# Altium footprint library kalios.PcbLib: 404 footprints (part 10 of 26)
Each footprint in its own frame and in the unit in brackets; x right, y up, seen from the top. Pads: shape width x height; smd on the part's side, far side on the other; paste and mask are expansions set on the pad; w line width, h text height; cw(c..) or ccw(c..) is an arc to the next point about the centre after c.
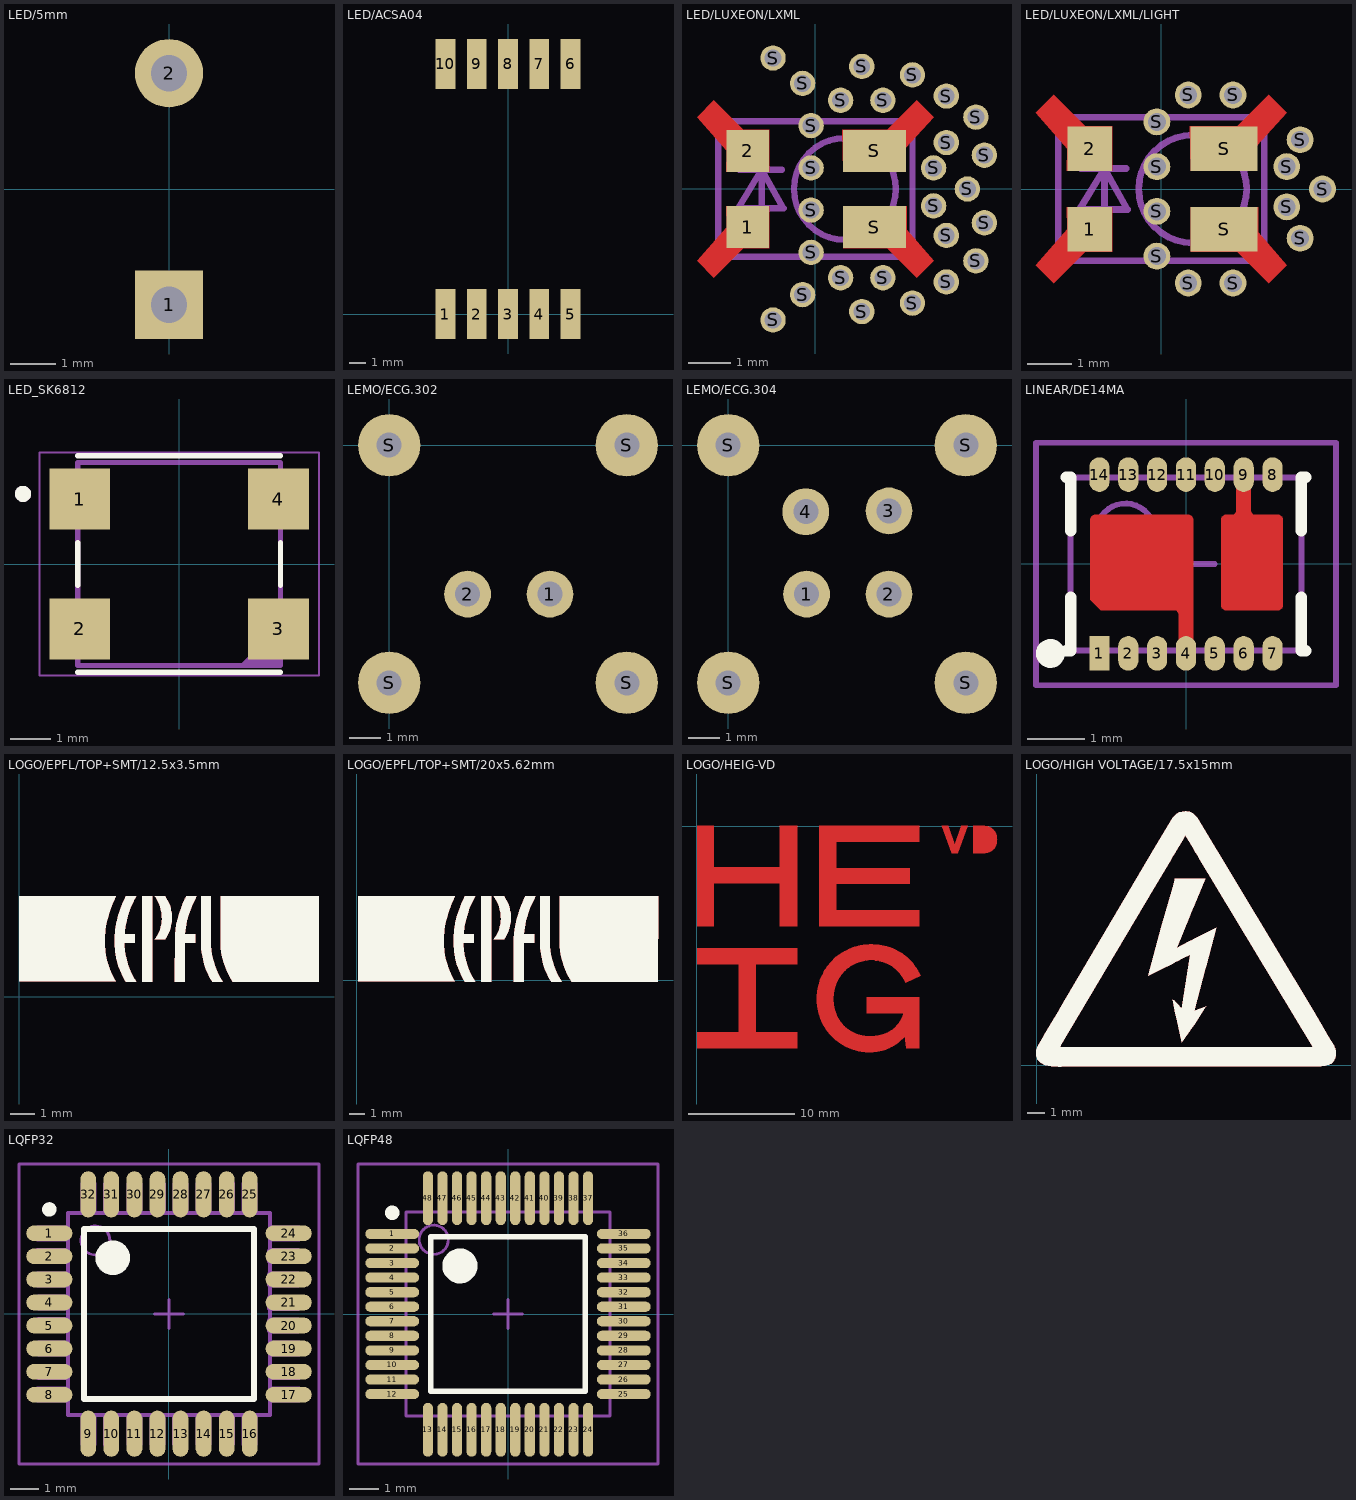
[diagram p9: the footprints below, top view; thin cyan lines are the x and y axes]

## LED/5mm [mm]
pads (2):
  rect 1.5x1.5 hole 0.8: 1(0,-2.54)
  round 1.5 hole 0.8: 2(0,2.54)
Top Designator:
  text ".Designator" at -7.618,-0.508 h1.52
3D body "led.STEP": height 13.86, standoff -1.97, extent -2.999,-2.7 2.999,3

## LED/ACSA04 [mm]
pads (10):
  rect 1.2x3 smd: 1(-3.76,0) 2(-1.88,0) 3(0,0) 4(1.88,0) 5(3.76,0) 6(3.76,15.04) 7(1.88,15.04) 8(0,15.04) 9(-1.88,15.04) 10(-3.76,15.04)
Top Designator:
  text ".Designator" at -7.617,7.012 h1.52
3D body "User Library-ACSA04_Blue.STEP": height 3.75, standoff -0.01, extent -4.56,0.01 4.56,15.03

## LED/LUXEON/LXML [mm]
pads (31):
  rect 1x1 smd: 1(-1.6,-0.9) 2(-1.6,0.9)
  round 0.6 hole 0.4: S(-1,-3.1) S(-1,3.1) S(-0.3,-2.5) S(-0.3,2.5) S(-0.1,-1.5) S(-0.1,-0.5) S(-0.1,0.5) S(-0.1,1.5) S(0.6,-2.1) S(0.6,2.1) S(1.1,-2.9) S(1.1,2.9) S(1.6,-2.1) S(1.6,2.1) S(2.3,-2.7) S(2.3,2.7) S(2.8,-0.4) S(2.8,0.5) S(3.1,-2.2) S(3.1,-1.1) S(3.1,1.1) S(3.1,2.2) S(3.6,0) S(3.8,-1.7) S(3.8,1.7) S(4,-0.8) S(4,0.8)
  rect 1.5x1 smd: S(1.4,-0.9) S(1.4,0.9)
Top Layer:
  region: 1.7,1.4 2.4,2.1 2.8,1.7 2.134,0.965 2.134,0.406 0.66,0.406 0.635,1.397
  region: 1.7,-1.4 2.4,-2.1 2.8,-1.7 2.159,-0.965 2.159,-0.406 0.66,-0.406 0.66,-1.397
  region: -1.7,-1.4 -2.4,-2.1 -2.8,-1.7 -2.1,-0.9 -2.108,-0.406 -1.092,-0.406 -1.092,-1.397
  region: -1.7,1.4 -2.4,2.1 -2.8,1.7 -2.1,0.9 -2.108,0.406 -1.092,0.406 -1.092,1.397
Top Courtyard:
  circle w0.15: c0.7,0 r1.204
  lines w0.15: -1.803,0.457 -0.787,0.457 ; -1.27,-0.889 -1.27,0.965 ; -1.27,0.457 -0.762,-0.457 ; -1.243,0.502 -1.829,-0.457 -0.749,-0.457 ; -2.3,-1.6 -2.3,1.6 2.3,1.6 2.3,-1.6 -2.3,-1.6
Top Designator:
  text ".Designator" at -6.817,-0.508 h1.52
3D body "LUXEON Rebel.STEP": height 1.98, standoff -0.01, extent -2.305,-1.585 2.305,1.585

## LED/LUXEON/LXML/LIGHT [mm]
pads (17):
  rect 1x1 smd: 1(-1.6,-0.9) 2(-1.6,0.9)
  round 0.6 hole 0.4: S(-0.1,-1.5) S(-0.1,-0.5) S(-0.1,0.5) S(-0.1,1.5) S(0.6,-2.1) S(0.6,2.1) S(1.6,-2.1) S(1.6,2.1) S(2.8,-0.4) S(2.8,0.5) S(3.1,-1.1) S(3.1,1.1) S(3.6,0)
  rect 1.5x1 smd: S(1.4,-0.9) S(1.4,0.9)
Top Layer:
  region: -1.7,1.4 -2.4,2.1 -2.8,1.7 -2.1,0.9 -2.108,0.406 -1.092,0.406 -1.092,1.397
  region: -1.7,-1.4 -2.4,-2.1 -2.8,-1.7 -2.1,-0.9 -2.108,-0.406 -1.092,-0.406 -1.092,-1.397
  region: 1.7,-1.4 2.4,-2.1 2.8,-1.7 2.159,-0.965 2.159,-0.406 0.66,-0.406 0.66,-1.397
  region: 1.7,1.4 2.4,2.1 2.8,1.7 2.134,0.965 2.134,0.406 0.66,0.406 0.635,1.397
Top Courtyard:
  circle w0.15: c0.7,0 r1.204
  lines w0.15: -1.803,0.457 -0.787,0.457 ; -1.27,-0.889 -1.27,0.965 ; -1.27,0.457 -0.762,-0.457 ; -1.243,0.502 -1.829,-0.457 -0.749,-0.457 ; -2.3,-1.6 2.3,-1.6 2.3,1.6 -2.3,1.6 -2.3,-1.6
Top Designator:
  text ".Designator" at -7.017,-0.508 h1.52
3D body "LUXEON Rebel.STEP": height 1.98, standoff -0.01, extent -2.305,-1.585 2.305,1.585

## LED_SK6812 [mm]
pads (4):
  rect 1.5x1.5 smd: 1(-2.45,1.6) 2(-2.45,-1.6) 3(2.45,-1.6) 4(2.45,1.6)
Top Overlay:
  circle w0.2: c-3.85,1.73 r0.1
  lines w0.127: -2.5,-2.67 2.5,-2.67 ; -2.5,-0.53 -2.5,0.53 ; -2.5,2.67 2.5,2.67 ; 2.5,-0.53 2.5,0.53
Top 3D Body:
  circle w0.2: c-3.85,1.73 r0.1
  region: 2.5,-2.5 1.5,-2.5 2.5,-1.5
  lines w0.127: -2.5,-2.5 2.5,-2.5 2.5,2.5 -2.5,2.5 -2.5,-2.5
Top Courtyard:
  lines w0.05: -3.45,-2.75 3.45,-2.75 3.45,2.75 -3.45,2.75 -3.45,-2.75
3D body "step_temp.STEP": height 1.6, standoff 0, extent -2.7,-2.5 2.7,2.5

## LEMO/ECG.302 [mm]
pads (6):
  round 1.5 hole 0.8 unplated: 1(5.156,-4.775) 2(2.515,-4.775)
  round 2 hole 0.8 unplated: S(0,-7.62) S(0,0) S(7.62,-7.62) S(7.62,0)
Top Designator:
  text ".Designator" at -3.79,1.681 h1.52
3D body "lemo2.STEP": height 12.69, standoff -3, extent -2.023,-10.211 9.677,14.589

## LEMO/ECG.304 [mm]
pads (8):
  round 1.5 hole 0.8 unplated: 1(2.515,-4.775) 2(5.156,-4.775) 3(5.156,-2.108) 4(2.489,-2.134)
  round 2 hole 0.8 unplated: S(0,-7.62) S(0,0) S(7.62,-7.62) S(7.62,0)
Top Designator:
  text ".Designator" at -3.79,1.681 h1.52
3D body "lemo4.STEP": height 12.69, standoff -3, extent -2.023,-10.211 9.677,14.589

## LINEAR/DE14MA [mm] "QFN, 14-Leads, Body 3.0x4.0mm (max), Pitch 0.50mm, IPC Medium Density"
height 0.75
pads (14):
  rect 0.35x0.6 smd: 1(-1.5,-1.55)
  oval 0.35x0.6 smd: 2(-1,-1.55) 3(-0.5,-1.55) 4(0,-1.55) 5(0.5,-1.55) 6(1,-1.55) 7(1.5,-1.55) 8(1.5,1.55) 9(1,1.55) 10(0.5,1.55) 11(0,1.55) 12(-0.5,1.55) 13(-1,1.55) 14(-1.5,1.55)
Top Layer:
  region: -1.656,-0.623 -1.479,-0.8 -0.206,-0.8 -0.19,-0.801 -0.161,-0.813 -0.139,-0.835 -0.127,-0.864 -0.126,-0.88 -0.126,-1.337 0.124,-1.337 0.124,0.77 0.124,0.786 0.112,0.816 0.09,0.838 0.06,0.85 0.044,0.85 -1.576,0.85 -1.591,0.85 -1.621,0.838 -1.643,0.816 -1.656,0.786 -1.656,0.77
  region: 0.61,-0.72 0.61,0.77 0.61,0.786 0.623,0.816 0.645,0.838 0.674,0.85 0.69,0.85 0.794,0.85 0.81,0.852 0.839,0.864 0.861,0.886 0.873,0.915 0.874,0.93 0.874,1.288 0.889,1.473 1.118,1.473 1.124,1.288 1.124,0.93 1.126,0.915 1.138,0.886 1.16,0.864 1.189,0.852 1.204,0.85 1.6,0.85 1.616,0.85 1.646,0.838 1.668,0.816 1.68,0.786 1.68,0.77 1.68,-0.72 1.68,-0.736 1.668,-0.765 1.646,-0.787 1.616,-0.8 1.6,-0.8 0.69,-0.8 0.674,-0.8 0.645,-0.787 0.623,-0.765 0.61,-0.736
Top Overlay:
  circle w0.25: c-2.35,-1.55 r0.125
  lines w0.2: -2.075,-1.5 -2,-1.5 -2,-0.575 ; -2.075,1.5 -2,1.5 -2,0.575 ; 2,-0.575 2,-1.5 2.075,-1.5 ; 2,0.575 2,1.5 2.075,1.5
Top 3D Body:
  circle w0.1: c-1.05,0.55 r0.5
  lines w0.1: -2,-1.5 2,-1.5 2,1.5 -2,1.5 -2,-1.5
Top Courtyard:
  lines w0.1: -0.5,0 0.5,0 ; 0,-0.5 0,0.5 ; -2.6,-2.1 2.6,-2.1 2.6,2.1 -2.6,2.1 -2.6,-2.1
Top Designator:
  text ".Designator" at -7.618,-0.508 h1.52
3D body "DE14MA.STEP": height 0.75, standoff -0.05, extent -2.007,-1.485 1.993,1.535

## LOGO/EPFL/TOP+SMT/12.5x3.5mm [mm]
Top Layer:
  region: 6.287,3.174 6.287,3.345 6.29,3.319
  region: 6.287,3.174 6.276,3.471 6.287,3.345
  region: 6.276,3.076 6.276,3.471 6.287,3.174
  region: 6.276,3.076 6.272,3.492 6.276,3.471
  region: 6.272,3.038 6.272,3.492 6.276,3.076
  region: 6.272,3.038 6.247,3.619 6.272,3.492
  region: 6.247,2.912 6.247,3.619 6.272,3.038
  region: 6.247,2.912 6.245,3.63 6.247,3.619
  region: 6.245,2.904 6.245,3.63 6.247,2.912
  region: 6.245,2.904 6.215,3.724 6.245,3.63
  region: 6.215,2.797 6.215,3.724 6.245,2.904
  region: 6.215,2.797 6.192,3.794 6.215,3.724
  region: 6.192,2.734 6.192,3.794 6.215,2.797
  region: 6.192,2.734 6.177,3.826 6.192,3.794
  region: 6.177,2.694 6.177,3.826 6.192,2.734
  region: 6.177,2.694 6.138,3.912 6.177,3.826
  region: 6.138,2.603 6.138,3.912 6.177,2.694
  region: 6.138,2.603 6.116,3.963 6.138,3.912
  region: 6.116,2.557 6.116,3.963 6.138,2.603
  region: 6.116,2.557 6.1,3.988 6.116,3.963
  region: 6.1,2.527 6.1,3.988 6.116,2.557
  region: 6.1,2.527 6.038,4.092 6.1,3.988
  region: 6.038,2.42 6.038,4.092 6.1,2.527
  region: 6.038,2.42 6.012,4.135 6.038,4.092
  region: 6.012,2.383 6.012,4.135 6.038,2.42
  region: 6.012,2.383 5.884,4.135 6.012,4.135
  region: 5.884,2.383 5.884,4.135 6.012,2.383
  region: 5.884,3.18 5.882,4.135 5.884,4.135
  region: 5.882,3.324 5.882,4.135 5.884,3.18
  region: 5.884,2.383 5.882,3.154 5.884,3.18
  region: 5.882,2.383 5.882,3.154 5.884,2.383
  region: 5.882,3.324 5.87,4.135 5.882,4.135
  region: 5.87,3.423 5.87,4.135 5.882,3.324
  region: 5.882,2.383 5.87,3.028 5.882,3.154
  region: 5.87,2.383 5.87,3.028 5.882,2.383
  region: 5.87,3.423 5.865,4.135 5.87,4.135
  region: 5.865,3.461 5.865,4.135 5.87,3.423
  region: 5.87,2.383 5.865,3.007 5.87,3.028
  region: 5.865,2.383 5.865,3.007 5.87,2.383
  region: 5.865,3.461 5.839,4.135 5.865,4.135
  region: 5.839,3.589 5.839,4.135 5.865,3.461
  region: 5.865,2.383 5.839,2.883 5.865,3.007
  region: 5.839,2.383 5.839,2.883 5.865,2.383
  region: 5.839,3.589 5.836,4.135 5.839,4.135
  region: 5.836,3.597 5.836,4.135 5.839,3.589
  region: 5.839,2.383 5.836,2.872 5.839,2.883
  region: 5.836,2.383 5.836,2.872 5.839,2.383
  region: 5.836,3.597 5.804,4.135 5.836,4.135
  region: 5.804,3.707 5.804,4.135 5.836,3.597
  region: 5.836,2.383 5.804,2.78 5.836,2.872
  region: 5.804,2.383 5.804,2.78 5.836,2.383
  region: 5.804,3.707 5.78,4.135 5.804,4.135
  region: 5.78,3.771 5.78,4.135 5.804,3.707
  region: 5.804,2.383 5.78,2.711 5.804,2.78
  region: 5.78,2.383 5.78,2.711 5.804,2.383
  region: 5.78,3.771 5.765,4.135 5.78,4.135
  region: 5.765,3.813 5.765,4.135 5.78,3.771
  region: 5.78,2.383 5.765,2.68 5.78,2.711
  region: 5.765,2.383 5.765,2.68 5.78,2.383
  region: 5.765,3.813 5.724,4.135 5.765,4.135
  region: 5.724,3.906 5.724,4.135 5.765,3.813
  region: 5.765,2.383 5.724,2.597 5.765,2.68
  region: 5.724,2.383 5.724,2.597 5.765,2.383
  region: 5.724,3.906 5.699,4.135 5.724,4.135
  region: 5.699,3.953 5.699,4.135 5.724,3.906
  region: 5.724,2.383 5.699,2.548 5.724,2.597
  region: 5.699,2.383 5.699,2.548 5.724,2.383
  region: 5.699,3.953 5.683,4.135 5.699,4.135
  region: 5.683,3.985 5.683,4.135 5.699,3.953
  region: 5.699,2.383 5.683,2.523 5.699,2.548
  region: 5.683,2.383 5.683,2.523 5.699,2.383
  region: 5.683,3.985 5.617,4.135 5.683,4.135
  region: 5.617,4.096 5.617,4.135 5.683,3.985
  region: 5.683,2.383 5.617,2.424 5.683,2.523
  region: 5.617,2.383 5.617,2.424 5.683,2.383
  region: 5.617,4.096 5.59,4.135 5.617,4.135
  region: 5.617,2.383 5.59,2.383 5.617,2.424
  region: 5.477,0.635 5.08,4.135 5.477,4.135
  region: 5.08,0.635 5.08,4.135 5.477,0.635
  region: 12.339,0.635 12.339,4.135 12.342,4.135
  region: 12.339,0.635 8.789,4.135 12.339,4.135
  region: 8.789,0.635 8.789,4.135 12.339,0.635
  region: 8.789,0.635 8.696,4.135 8.789,4.135
  region: 8.696,0.791 8.696,4.135 8.789,0.635
  region: 8.696,0.791 8.548,4.135 8.696,4.135
  region: 8.548,1.092 8.548,4.135 8.696,0.791
  region: 8.548,1.092 8.442,4.135 8.548,4.135
  region: 8.442,1.374 8.442,4.135 8.548,1.092
  region: 8.442,1.374 8.37,4.135 8.442,4.135
  region: 8.37,1.629 8.37,4.135 8.442,1.374
  region: 8.37,1.629 8.327,4.135 8.37,4.135
  region: 8.327,1.848 8.327,4.135 8.37,1.629
  region: 8.327,1.848 8.305,4.135 8.327,4.135
  region: 8.305,2.023 8.305,4.135 8.327,1.848
  region: 8.305,2.023 8.297,4.135 8.305,4.135
  region: 8.297,2.148 8.297,4.135 8.305,2.023
  region: 8.297,2.148 8.295,4.135 8.297,4.135
  region: 8.286,0.635 8.286,0.791 8.378,0.635
  region: 8.286,0.635 8.206,0.944 8.286,0.791
  region: 8.206,0.635 8.206,0.944 8.286,0.635
  region: 8.206,0.635 8.079,1.236 8.206,0.944
  region: 8.079,0.635 8.079,1.236 8.206,0.635
  region: 8.079,0.635 7.991,1.505 8.079,1.236
  region: 7.991,0.635 7.991,1.505 8.079,0.635
  region: 7.991,0.635 7.951,1.675 7.991,1.505
  region: 7.951,0.635 7.951,1.675 7.991,0.635
  region: 7.951,0.635 7.935,1.743 7.951,1.675
  region: 7.935,0.661 7.935,1.743 7.951,0.635
  region: 7.935,0.661 7.903,1.941 7.935,1.743
  region: 7.903,0.712 7.903,1.941 7.935,0.661
  region: 7.903,0.712 7.889,2.092 7.903,1.941
  region: 7.889,0.734 7.889,2.092 7.903,0.712
  region: 7.889,0.734 7.887,2.223 7.889,2.092
  region: 7.887,0.739 7.887,2.223 7.889,0.734
  region: 7.887,0.739 7.884,4.135 7.887,2.223
  region: 7.884,0.742 7.884,4.135 7.887,0.739
  region: 7.884,0.742 7.876,4.135 7.884,4.135
  region: 7.876,0.756 7.876,4.135 7.884,0.742
  region: 7.876,0.756 7.799,4.135 7.876,4.135
  region: 7.799,0.903 7.799,4.135 7.876,0.756
  region: 7.799,0.903 7.712,4.135 7.799,4.135
  region: 7.712,1.103 7.712,4.135 7.799,0.903
  region: 7.712,1.103 7.627,4.135 7.712,4.135
  region: 7.627,1.354 7.627,4.135 7.712,1.103
  region: 7.627,1.354 7.553,4.135 7.627,4.135
  region: 7.553,1.654 7.553,4.135 7.627,1.354
  region: 7.553,1.654 7.525,4.135 7.553,4.135
  region: 7.525,1.82 7.525,4.135 7.553,1.654
  region: 7.525,1.82 7.505,4.135 7.525,4.135
  region: 7.505,1.998 7.505,4.135 7.525,1.82
  region: 7.505,1.998 7.493,4.135 7.505,4.135
  region: 7.493,2.185 7.493,4.135 7.505,1.998
  region: 7.493,2.185 7.492,4.135 7.493,4.135
  region: 7.25,4.03 7.25,4.134 7.302,4.134
  region: 7.25,4.03 7.156,4.134 7.25,4.134
  region: 7.156,3.842 7.156,4.134 7.25,4.03
  region: 7.25,2.223 7.156,2.585 7.25,2.585
  region: 7.156,2.223 7.156,2.585 7.25,2.223
  region: 7.156,3.842 6.985,4.134 7.156,4.134
  region: 6.985,3.405 6.985,4.134 7.156,3.842
  region: 7.156,2.223 6.985,2.585 7.156,2.585
  region: 6.985,2.223 6.985,2.585 7.156,2.223
  region: 6.985,3.405 6.909,4.134 6.985,4.134
  region: 6.909,3.144 6.909,4.134 6.985,3.405
  region: 6.985,2.223 6.909,2.585 6.985,2.585
  region: 6.909,2.223 6.909,2.585 6.985,2.223
  region: 6.909,3.144 6.875,4.134 6.909,4.134
  region: 6.875,2.977 6.875,4.134 6.909,3.144
  region: 6.909,2.223 6.875,2.585 6.909,2.585
  region: 6.875,2.223 6.875,2.585 6.909,2.223
  region: 6.875,2.977 6.852,4.087 6.875,4.134
  region: 6.852,2.867 6.852,4.087 6.875,2.977
  region: 6.875,2.223 6.852,2.585 6.875,2.585
  region: 6.852,2.223 6.852,2.585 6.875,2.223
  region: 6.852,2.867 6.835,4.05 6.852,4.087
  region: 6.835,2.726 6.835,4.05 6.852,2.867
  region: 6.852,2.223 6.835,2.585 6.852,2.585
  region: 6.835,2.223 6.835,2.585 6.852,2.223
  region: 6.835,2.726 6.827,4.032 6.835,4.05
  region: 6.827,2.585 6.827,4.032 6.835,2.726
  region: 6.835,2.223 6.827,2.585 6.835,2.585
  region: 6.827,2.223 6.827,2.585 6.835,2.223
  region: 6.827,2.223 6.82,4.018 6.827,4.032
  region: 6.82,2.223 6.82,4.018 6.827,2.223
  region: 6.82,0.635 6.761,3.891 6.82,4.018
  region: 6.761,0.635 6.761,3.891 6.82,0.635
  region: 6.761,0.635 6.666,3.654 6.761,3.891
  region: 6.666,0.635 6.666,3.654 6.761,0.635
  region: 6.666,0.635 6.588,3.424 6.666,3.654
  region: 6.588,0.635 6.588,3.424 6.666,0.635
  region: 6.588,0.635 6.526,3.201 6.588,3.424
  region: 6.526,0.635 6.526,3.201 6.588,0.635
  region: 6.526,0.635 6.479,2.985 6.526,3.201
  region: 6.479,0.635 6.479,2.985 6.526,0.635
  region: 6.479,0.635 6.446,2.776 6.479,2.985
  region: 6.446,0.635 6.446,2.776 6.479,0.635
  region: 6.446,0.635 6.425,2.576 6.446,2.776
  region: 6.425,0.635 6.425,2.576 6.446,0.635
  region: 6.425,0.635 6.417,0.635 6.425,2.576
  region: 3.94,4.04 3.94,4.135 3.982,4.135
  region: 3.94,0.637 3.94,0.702 3.982,0.637
  region: 3.94,4.04 3.837,4.135 3.94,4.135
  region: 3.837,3.81 3.837,4.135 3.94,4.04
  region: 3.94,0.637 3.837,0.892 3.94,0.702
  region: 3.837,0.637 3.837,0.892 3.94,0.637
  region: 3.837,3.81 3.812,4.135 3.837,4.135
  region: 3.812,3.754 3.812,4.135 3.837,3.81
  region: 3.837,0.637 3.812,0.947 3.837,0.892
  region: 3.812,0.637 3.812,0.947 3.837,0.637
  region: 3.812,3.754 3.774,4.135 3.812,4.135
  region: 3.774,3.645 3.774,4.135 3.812,3.754
  region: 3.812,0.637 3.774,1.031 3.812,0.947
  region: 3.774,0.637 3.774,1.031 3.812,0.637
  region: 3.774,3.645 3.709,4.135 3.774,4.135
  region: 3.709,3.46 3.709,4.135 3.774,3.645
  region: 3.774,0.637 3.709,1.197 3.774,1.031
  region: 3.709,0.637 3.709,1.197 3.774,0.637
  region: 3.709,3.46 3.685,4.135 3.709,4.135
  region: 3.685,3.39 3.685,4.135 3.709,3.46
  region: 3.709,0.637 3.685,1.274 3.709,1.197
  region: 3.685,0.637 3.685,1.274 3.709,0.637
  region: 3.685,3.39 3.648,4.135 3.685,4.135
  region: 3.648,3.242 3.648,4.135 3.685,3.39
  region: 3.685,0.637 3.648,1.391 3.685,1.274
  region: 3.648,0.637 3.648,1.391 3.685,0.637
  region: 3.648,3.242 3.598,4.135 3.648,4.135
  region: 3.598,3.043 3.598,4.135 3.648,3.242
  region: 3.648,0.637 3.598,1.593 3.648,1.391
  region: 3.598,0.637 3.598,1.593 3.648,0.637
  region: 3.598,3.043 3.594,4.135 3.598,4.135
  region: 3.594,3.018 3.594,4.135 3.598,3.043
  region: 3.598,0.637 3.594,1.609 3.598,1.593
  region: 3.594,0.637 3.594,1.609 3.598,0.637
  region: 3.594,3.018 3.552,4.135 3.594,4.135
  region: 3.552,2.757 3.552,4.135 3.594,3.018
  region: 3.594,0.637 3.552,1.852 3.594,1.609
  region: 3.552,0.637 3.552,1.852 3.594,0.637
  region: 3.552,2.757 3.546,4.135 3.552,4.135
  region: 3.546,2.714 3.546,4.135 3.552,2.757
  region: 3.552,0.637 3.546,1.923 3.552,1.852
  region: 3.546,0.637 3.546,1.923 3.552,0.637
  region: 3.546,2.714 3.527,4.135 3.546,4.135
  region: 3.527,2.459 3.527,4.135 3.546,2.714
  region: 3.546,0.637 3.527,2.118 3.546,1.923
  region: 3.527,0.637 3.527,2.118 3.546,0.637
  region: 3.527,2.459 3.523,4.135 3.527,4.135
  region: 3.523,2.406 3.523,4.135 3.527,2.459
  region: 3.527,0.637 3.523,2.406 3.527,2.118
  region: 3.523,0.637 3.523,2.406 3.527,0.637
  region: 3.523,0.637 0,4.135 3.523,4.135
  region: 0,0.637 0,4.135 3.523,0.637
  region: 4.765,4.036 4.765,4.135 4.816,4.135
  region: 4.765,0.636 4.765,0.723 4.816,0.636
  region: 4.765,4.036 4.745,4.135 4.765,4.135
  region: 4.745,3.998 4.745,4.135 4.765,4.036
  region: 4.765,2.224 4.745,2.586 4.765,2.586
  region: 4.745,2.224 4.745,2.586 4.765,2.224
  region: 4.765,0.636 4.745,0.757 4.765,0.723
  region: 4.745,0.636 4.745,0.757 4.765,0.636
  region: 4.745,3.998 4.724,4.135 4.745,4.135
  region: 4.724,3.952 4.724,4.135 4.745,3.998
  region: 4.745,2.224 4.724,2.586 4.745,2.586
  region: 4.724,2.224 4.724,2.586 4.745,2.224
  region: 4.745,0.636 4.724,0.791 4.745,0.757
  region: 4.724,0.636 4.724,0.791 4.745,0.636
  region: 4.724,3.952 4.644,4.135 4.724,4.135
  region: 4.644,3.773 4.644,4.135 4.724,3.952
  region: 4.724,2.224 4.644,2.586 4.724,2.586
  region: 4.644,2.224 4.644,2.586 4.724,2.224
  region: 4.724,0.636 4.644,0.944 4.724,0.791
  region: 4.644,0.636 4.644,0.944 4.724,0.636
  region: 4.644,3.773 4.586,4.135 4.644,4.135
  region: 4.586,3.642 4.586,4.135 4.644,3.773
  region: 4.644,2.224 4.586,2.586 4.644,2.586
  region: 4.586,2.224 4.586,2.586 4.644,2.224
  region: 4.644,0.636 4.586,1.08 4.644,0.944
  region: 4.586,0.636 4.586,1.08 4.644,0.636
  region: 4.586,3.642 4.518,4.135 4.586,4.135
  region: 4.518,3.455 4.518,4.135 4.586,3.642
  region: 4.586,2.224 4.518,2.586 4.586,2.586
  region: 4.518,2.224 4.518,2.586 4.586,2.224
  region: 4.586,0.636 4.518,1.237 4.586,1.08
  region: 4.518,0.636 4.518,1.237 4.586,0.636
  region: 4.518,3.455 4.5,4.135 4.518,4.135
  region: 4.5,3.406 4.5,4.135 4.518,3.455
  region: 4.518,2.224 4.5,2.586 4.518,2.586
  region: 4.5,2.224 4.5,2.586 4.518,2.224
  region: 4.518,0.636 4.5,1.292 4.518,1.237
  region: 4.5,0.636 4.5,1.292 4.518,0.636
  region: 4.5,3.406 4.429,4.135 4.5,4.135
  region: 4.429,3.165 4.429,4.135 4.5,3.406
  region: 4.5,2.224 4.429,2.586 4.5,2.586
  region: 4.429,2.224 4.429,2.586 4.5,2.224
  region: 4.5,0.636 4.429,1.506 4.5,1.292
  region: 4.429,0.636 4.429,1.506 4.5,0.636
  region: 4.429,3.165 4.423,4.135 4.429,4.135
  region: 4.423,3.145 4.423,4.135 4.429,3.165
  region: 4.429,2.224 4.423,2.586 4.429,2.586
  region: 4.423,2.224 4.423,2.586 4.429,2.224
  region: 4.429,0.636 4.423,1.531 4.429,1.506
  region: 4.423,0.636 4.423,1.531 4.429,0.636
  region: 4.423,3.145 4.389,4.135 4.423,4.135
  region: 4.389,2.977 4.389,4.135 4.423,3.145
  region: 4.423,2.224 4.389,2.586 4.423,2.586
  region: 4.389,2.224 4.389,2.586 4.423,2.224
  region: 4.423,0.636 4.389,1.675 4.423,1.531
  region: 4.389,0.636 4.389,1.675 4.423,0.636
  region: 4.389,2.977 4.373,4.099 4.389,4.135
  region: 4.373,2.897 4.373,4.099 4.389,2.977
  region: 4.389,2.224 4.373,2.586 4.389,2.586
  region: 4.373,2.224 4.373,2.586 4.389,2.224
  region: 4.389,0.636 4.373,1.743 4.389,1.675
  region: 4.373,0.661 4.373,1.743 4.389,0.636
  region: 4.373,2.897 4.367,4.086 4.373,4.099
  region: 4.367,2.868 4.367,4.086 4.373,2.897
  region: 4.373,2.224 4.367,2.586 4.373,2.586
  region: 4.367,2.224 4.367,2.586 4.373,2.224
  region: 4.373,0.661 4.367,1.78 4.373,1.743
  region: 4.367,0.67 4.367,1.78 4.373,0.661
  region: 4.367,2.868 4.35,4.047 4.367,4.086
  region: 4.35,2.727 4.35,4.047 4.367,2.868
  region: 4.367,2.224 4.35,2.586 4.367,2.586
  region: 4.35,2.224 4.35,2.586 4.367,2.224
  region: 4.367,0.67 4.35,1.888 4.367,1.78
  region: 4.35,0.696 4.35,1.888 4.367,0.67
  region: 4.35,2.727 4.347,4.04 4.35,4.047
  region: 4.347,2.67 4.347,4.04 4.35,2.727
  region: 4.35,2.224 4.347,2.586 4.35,2.586
  region: 4.347,2.224 4.347,2.586 4.35,2.224
  region: 4.35,0.696 4.347,1.908 4.35,1.888
  region: 4.347,0.701 4.347,1.908 4.35,0.696
  region: 4.347,2.67 4.342,4.029 4.347,4.04
  region: 4.342,2.586 4.342,4.029 4.347,2.67
  region: 4.347,2.224 4.342,2.586 4.347,2.586
  region: 4.342,2.224 4.342,2.586 4.347,2.224
  region: 4.347,0.701 4.342,1.938 4.347,1.908
  region: 4.342,0.71 4.342,1.938 4.347,0.701
  region: 4.342,2.224 4.341,4.028 4.342,4.029
  region: 4.341,2.224 4.341,4.028 4.342,2.224
  region: 4.342,0.71 4.341,1.942 4.342,1.938
  region: 4.341,0.711 4.341,1.942 4.342,0.71
  region: 4.341,2.224 4.327,3.997 4.341,4.028
  region: 4.327,2.224 4.327,3.997 4.341,2.224
  region: 4.341,0.711 4.327,2.093 4.341,1.942
  region: 4.327,0.737 4.327,2.093 4.341,0.711
  region: 4.327,2.224 4.324,3.99 4.327,3.997
  region: 4.324,2.224 4.324,3.99 4.327,2.224
  region: 4.327,0.737 4.324,2.224 4.327,2.093
  region: 4.324,0.742 4.324,2.224 4.327,0.737
  region: 4.324,0.742 4.244,3.81 4.324,3.99
  region: 4.244,0.891 4.244,3.81 4.324,0.742
  region: 4.244,0.891 4.219,3.754 4.244,3.81
  region: 4.219,0.947 4.219,3.754 4.244,0.891
  region: 4.219,0.947 4.181,3.645 4.219,3.754
  region: 4.181,1.03 4.181,3.645 4.219,0.947
  region: 4.181,1.03 4.116,3.46 4.181,3.645
  region: 4.116,1.197 4.116,3.46 4.181,1.03
  region: 4.116,1.197 4.092,3.39 4.116,3.46
  region: 4.092,1.273 4.092,3.39 4.116,1.197
  region: 4.092,1.273 4.055,3.242 4.092,3.39
  region: 4.055,1.39 4.055,3.242 4.092,1.273
  region: 4.055,1.39 4.005,3.043 4.055,3.242
  region: 4.005,1.593 4.005,3.043 4.055,1.39
  region: 4.005,1.593 4.001,3.019 4.005,3.043
  region: 4.001,1.609 4.001,3.019 4.005,1.593
  region: 4.001,1.609 3.959,2.758 4.001,3.019
  region: 3.959,1.851 3.959,2.758 4.001,1.609
  region: 3.959,1.851 3.953,2.714 3.959,2.758
  region: 3.953,1.924 3.953,2.714 3.959,1.851
  region: 3.953,1.924 3.934,2.459 3.953,2.714
  region: 3.934,2.118 3.934,2.459 3.953,1.924
  region: 3.934,2.118 3.931,2.406 3.934,2.459
Top Overlay:
  drawing of 352 lines, arcs and shapes, not listed
Top Designator:
  text ".Designator" at -1.446,1.877 h1.52
